# Altium footprint library con-samtec.PCBLIB: 805 footprints (part 42 of 55)
Each footprint in its own frame and in the unit in brackets; x right, y up, seen from the top. Pads: shape width x height; smd on the part's side, far side on the other; paste and mask are expansions set on the pad; w line width, h text height; cw(c..) or ccw(c..) is an arc to the next point about the centre after c.
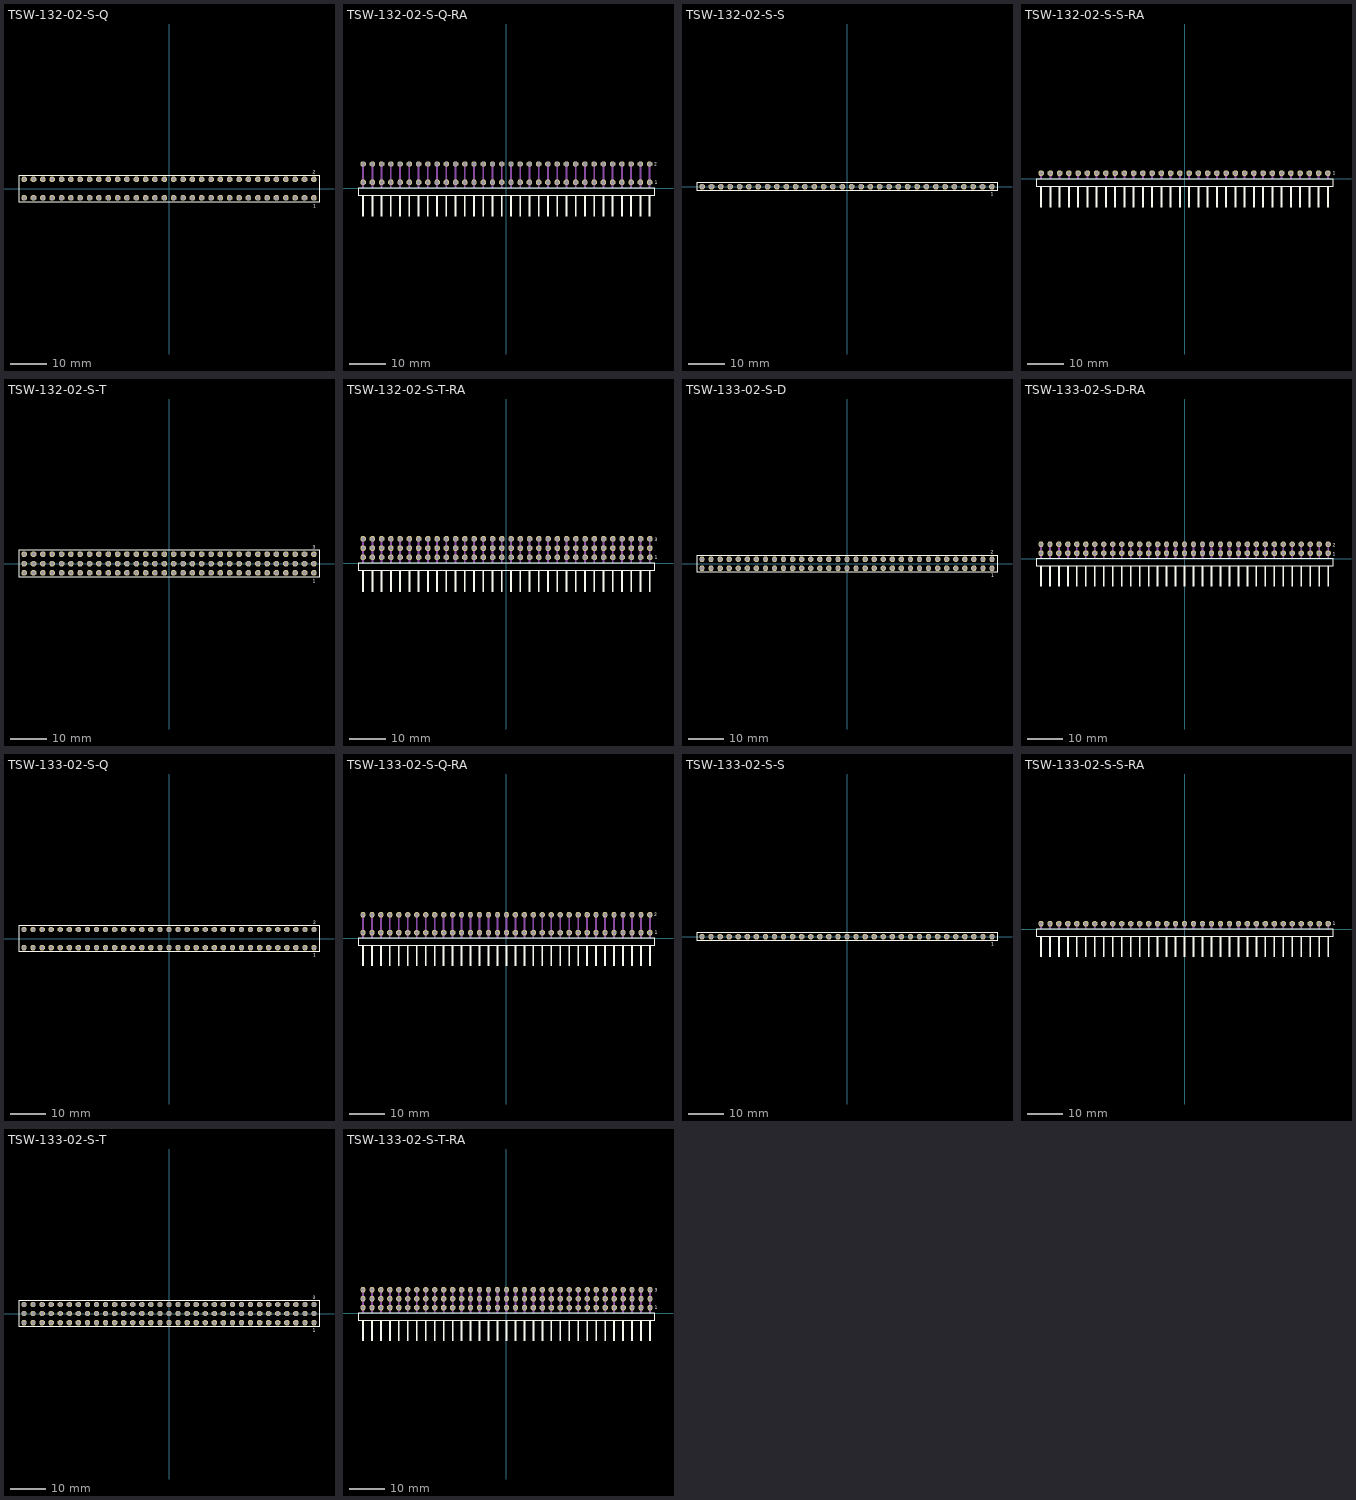
[diagram p41: the footprints below, top view; thin cyan lines are the x and y axes]

## TSW-132-02-S-Q [mm]
pads (64):
  oct 1.5x1.5 hole 1: 1(39.37,-2.54) 2(39.37,2.54) 3(36.83,-2.54) 4(36.83,2.54) 5(34.29,-2.54) 6(34.29,2.54) 7(31.75,-2.54) 8(31.75,2.54) 9(29.21,-2.54) 10(29.21,2.54) 11(26.67,-2.54) 12(26.67,2.54) 13(24.13,-2.54) 14(24.13,2.54) 15(21.59,-2.54) 16(21.59,2.54) 17(19.05,-2.54) 18(19.05,2.54) 19(16.51,-2.54) 20(16.51,2.54) 21(13.97,-2.54) 22(13.97,2.54) 23(11.43,-2.54) 24(11.43,2.54) 25(8.89,-2.54) 26(8.89,2.54) 27(6.35,-2.54) 28(6.35,2.54) 29(3.81,-2.54) 30(3.81,2.54) 31(1.27,-2.54) 32(1.27,2.54) 33(-1.27,-2.54) 34(-1.27,2.54) 35(-3.81,-2.54) 36(-3.81,2.54) 37(-6.35,-2.54) 38(-6.35,2.54) 39(-8.89,-2.54) 40(-8.89,2.54) 41(-11.43,-2.54) 42(-11.43,2.54) 43(-13.97,-2.54) 44(-13.97,2.54) 45(-16.51,-2.54) 46(-16.51,2.54) 47(-19.05,-2.54) 48(-19.05,2.54) 49(-21.59,-2.54) 50(-21.59,2.54) 51(-24.13,-2.54) 52(-24.13,2.54) 53(-26.67,-2.54) 54(-26.67,2.54) 55(-29.21,-2.54) 56(-29.21,2.54) 57(-31.75,-2.54) 58(-31.75,2.54) 59(-34.29,-2.54) 60(-34.29,2.54) 61(-36.83,-2.54) 62(-36.83,2.54) 63(-39.37,-2.54) 64(-39.37,2.54)
Top Overlay:
  lines w0.203: -40.769,-3.695 40.769,-3.695 40.769,3.695 -40.769,3.695 -40.769,-3.695
  text "1" at 39.212,-5.138 h0.94
  text "2" at 39.112,3.989 h0.94
Mechanical 16:
  rectangle: -39.72,-2.89 -39.02,-2.19
  rectangle: -39.72,2.19 -39.02,2.89
  rectangle: -37.18,-2.89 -36.48,-2.19
  rectangle: -37.18,2.19 -36.48,2.89
  rectangle: -34.64,-2.89 -33.94,-2.19
  rectangle: -34.64,2.19 -33.94,2.89
  rectangle: -32.1,-2.89 -31.4,-2.19
  rectangle: -32.1,2.19 -31.4,2.89
  rectangle: -29.56,-2.89 -28.86,-2.19
  rectangle: -29.56,2.19 -28.86,2.89
  rectangle: -27.02,-2.89 -26.32,-2.19
  rectangle: -27.02,2.19 -26.32,2.89
  rectangle: -24.48,-2.89 -23.78,-2.19
  rectangle: -24.48,2.19 -23.78,2.89
  rectangle: -21.94,-2.89 -21.24,-2.19
  rectangle: -21.94,2.19 -21.24,2.89
  rectangle: -19.4,-2.89 -18.7,-2.19
  rectangle: -19.4,2.19 -18.7,2.89
  rectangle: -16.86,-2.89 -16.16,-2.19
  rectangle: -16.86,2.19 -16.16,2.89
  rectangle: -14.32,-2.89 -13.62,-2.19
  rectangle: -14.32,2.19 -13.62,2.89
  rectangle: -11.78,-2.89 -11.08,-2.19
  rectangle: -11.78,2.19 -11.08,2.89
  rectangle: -9.24,-2.89 -8.54,-2.19
  rectangle: -9.24,2.19 -8.54,2.89
  rectangle: -6.7,-2.89 -6,-2.19
  rectangle: -6.7,2.19 -6,2.89
  rectangle: -4.16,-2.89 -3.46,-2.19
  rectangle: -4.16,2.19 -3.46,2.89
  rectangle: -1.62,-2.89 -0.92,-2.19
  rectangle: -1.62,2.19 -0.92,2.89
  rectangle: 0.92,-2.89 1.62,-2.19
  rectangle: 0.92,2.19 1.62,2.89
  rectangle: 3.46,-2.89 4.16,-2.19
  rectangle: 3.46,2.19 4.16,2.89
  rectangle: 6,-2.89 6.7,-2.19
  rectangle: 6,2.19 6.7,2.89
  rectangle: 8.54,-2.89 9.24,-2.19
  rectangle: 8.54,2.19 9.24,2.89
  rectangle: 11.08,-2.89 11.78,-2.19
  rectangle: 11.08,2.19 11.78,2.89
  rectangle: 13.62,-2.89 14.32,-2.19
  rectangle: 13.62,2.19 14.32,2.89
  rectangle: 16.16,-2.89 16.86,-2.19
  rectangle: 16.16,2.19 16.86,2.89
  rectangle: 18.7,-2.89 19.4,-2.19
  rectangle: 18.7,2.19 19.4,2.89
  rectangle: 21.24,-2.89 21.94,-2.19
  rectangle: 21.24,2.19 21.94,2.89
  rectangle: 23.78,-2.89 24.48,-2.19
  rectangle: 23.78,2.19 24.48,2.89
  rectangle: 26.32,-2.89 27.02,-2.19
  rectangle: 26.32,2.19 27.02,2.89
  rectangle: 28.86,-2.89 29.56,-2.19
  rectangle: 28.86,2.19 29.56,2.89
  rectangle: 31.4,-2.89 32.1,-2.19
  rectangle: 31.4,2.19 32.1,2.89
  rectangle: 33.94,-2.89 34.64,-2.19
  rectangle: 33.94,2.19 34.64,2.89
  rectangle: 36.48,-2.89 37.18,-2.19
  rectangle: 36.48,2.19 37.18,2.89
  rectangle: 39.02,-2.89 39.72,-2.19
  rectangle: 39.02,2.19 39.72,2.89

## TSW-132-02-S-Q-RA [mil]
pads (64):
  oct 59.06x59.06 hole 39.37: 1(1550,60) 2(1550,260) 3(1450,60) 4(1450,260) 5(1350,60) 6(1350,260) 7(1250,60) 8(1250,260) 9(1150,60) 10(1150,260) 11(1050,60) 12(1050,260) 13(950,60) 14(950,260) 15(850,60) 16(850,260) 17(750,60) 18(750,260) 19(650,60) 20(650,260) 21(550,60) 22(550,260) 23(450,60) 24(450,260) 25(350,60) 26(350,260) 27(250,60) 28(250,260) 29(150,60) 30(150,260) 31(50,60) 32(50,260) 33(-50,60) 34(-50,260) 35(-150,60) 36(-150,260) 37(-250,60) 38(-250,260) 39(-350,60) 40(-350,260) 41(-450,60) 42(-450,260) 43(-550,60) 44(-550,260) 45(-650,60) 46(-650,260) 47(-750,60) 48(-750,260) 49(-850,60) 50(-850,260) 51(-950,60) 52(-950,260) 53(-1050,60) 54(-1050,260) 55(-1150,60) 56(-1150,260) 57(-1250,60) 58(-1250,260) 59(-1350,60) 60(-1350,260) 61(-1450,60) 62(-1450,260) 63(-1550,60) 64(-1550,260)
Top Overlay:
  rectangle: -1560,-310.63 -1540,-80.32
  rectangle: -1460,-310.63 -1440,-80.32
  rectangle: -1360,-310.63 -1340,-80.32
  rectangle: -1260,-310.63 -1240,-80.32
  rectangle: -1160,-310.63 -1140,-80.32
  rectangle: -1060,-310.63 -1040,-80.32
  rectangle: -960,-310.63 -940,-80.32
  rectangle: -860,-310.63 -840,-80.32
  rectangle: -760,-310.63 -740,-80.32
  rectangle: -660,-310.63 -640,-80.32
  rectangle: -560,-310.63 -540,-80.32
  rectangle: -460,-310.63 -440,-80.32
  rectangle: -360,-310.63 -340,-80.32
  rectangle: -260,-310.63 -240,-80.32
  rectangle: -160,-310.63 -140,-80.32
  rectangle: -60,-310.63 -40,-80.32
  rectangle: 40,-310.63 60,-80.32
  rectangle: 140,-310.63 160,-80.32
  rectangle: 240,-310.63 260,-80.32
  rectangle: 340,-310.63 360,-80.32
  rectangle: 440,-310.63 460,-80.32
  rectangle: 540,-310.63 560,-80.32
  rectangle: 640,-310.63 660,-80.32
  rectangle: 740,-310.63 760,-80.32
  rectangle: 840,-310.63 860,-80.32
  rectangle: 940,-310.63 960,-80.32
  rectangle: 1040,-310.63 1060,-80.32
  rectangle: 1140,-310.63 1160,-80.32
  rectangle: 1240,-310.63 1260,-80.32
  rectangle: 1340,-310.63 1360,-80.32
  rectangle: 1440,-310.63 1460,-80.32
  rectangle: 1540,-310.63 1560,-80.32
  lines w8: -1605.08,-80.55 1605.08,-80.55 1605.08,-4.17 -1605.08,-4.17 -1605.08,-80.55
  text "1" at 1603.54,43.31 h36.81
  text "2" at 1601.18,242.72 h36.81
Mechanical 16:
  rectangle: -1560,0 -1540,270
  rectangle: -1460,0 -1440,270
  rectangle: -1360,0 -1340,270
  rectangle: -1260,0 -1240,270
  rectangle: -1160,0 -1140,270
  rectangle: -1060,0 -1040,270
  rectangle: -960,0 -940,270
  rectangle: -860,0 -840,270
  rectangle: -760,0 -740,270
  rectangle: -660,0 -640,270
  rectangle: -560,0 -540,270
  rectangle: -460,0 -440,270
  rectangle: -360,0 -340,270
  rectangle: -260,0 -240,270
  rectangle: -160,0 -140,270
  rectangle: -60,0 -40,270
  rectangle: 40,0 60,270
  rectangle: 140,0 160,270
  rectangle: 240,0 260,270
  rectangle: 340,0 360,270
  rectangle: 440,0 460,270
  rectangle: 540,0 560,270
  rectangle: 640,0 660,270
  rectangle: 740,0 760,270
  rectangle: 840,0 860,270
  rectangle: 940,0 960,270
  rectangle: 1040,0 1060,270
  rectangle: 1140,0 1160,270
  rectangle: 1240,0 1260,270
  rectangle: 1340,0 1360,270
  rectangle: 1440,0 1460,270
  rectangle: 1540,0 1560,270

## TSW-132-02-S-S [mm]
pads (32):
  oct 1.5x1.5 hole 1: 1(39.37,0) 2(36.83,0) 3(34.29,0) 4(31.75,0) 5(29.21,0) 6(26.67,0) 7(24.13,0) 8(21.59,0) 9(19.05,0) 10(16.51,0) 11(13.97,0) 12(11.43,0) 13(8.89,0) 14(6.35,0) 15(3.81,0) 16(1.27,0) 17(-1.27,0) 18(-3.81,0) 19(-6.35,0) 20(-8.89,0) 21(-11.43,0) 22(-13.97,0) 23(-16.51,0) 24(-19.05,0) 25(-21.59,0) 26(-24.13,0) 27(-26.67,0) 28(-29.21,0) 29(-31.75,0) 30(-34.29,0) 31(-36.83,0) 32(-39.37,0)
Top Overlay:
  lines w0.203: -40.769,-1.155 40.769,-1.155 40.769,1.155 -40.769,1.155 -40.769,-1.155
  text "1" at 39.112,-2.498 h0.94
Mechanical 16:
  rectangle: -39.72,-0.35 -39.02,0.35
  rectangle: -37.18,-0.35 -36.48,0.35
  rectangle: -34.64,-0.35 -33.94,0.35
  rectangle: -32.1,-0.35 -31.4,0.35
  rectangle: -29.56,-0.35 -28.86,0.35
  rectangle: -27.02,-0.35 -26.32,0.35
  rectangle: -24.48,-0.35 -23.78,0.35
  rectangle: -21.94,-0.35 -21.24,0.35
  rectangle: -19.4,-0.35 -18.7,0.35
  rectangle: -16.86,-0.35 -16.16,0.35
  rectangle: -14.32,-0.35 -13.62,0.35
  rectangle: -11.78,-0.35 -11.08,0.35
  rectangle: -9.24,-0.35 -8.54,0.35
  rectangle: -6.7,-0.35 -6,0.35
  rectangle: -4.16,-0.35 -3.46,0.35
  rectangle: -1.62,-0.35 -0.92,0.35
  rectangle: 0.92,-0.35 1.62,0.35
  rectangle: 3.46,-0.35 4.16,0.35
  rectangle: 6,-0.35 6.7,0.35
  rectangle: 8.54,-0.35 9.24,0.35
  rectangle: 11.08,-0.35 11.78,0.35
  rectangle: 13.62,-0.35 14.32,0.35
  rectangle: 16.16,-0.35 16.86,0.35
  rectangle: 18.7,-0.35 19.4,0.35
  rectangle: 21.24,-0.35 21.94,0.35
  rectangle: 23.78,-0.35 24.48,0.35
  rectangle: 26.32,-0.35 27.02,0.35
  rectangle: 28.86,-0.35 29.56,0.35
  rectangle: 31.4,-0.35 32.1,0.35
  rectangle: 33.94,-0.35 34.64,0.35
  rectangle: 36.48,-0.35 37.18,0.35
  rectangle: 39.02,-0.35 39.72,0.35

## TSW-132-02-S-S-RA [mil]
pads (32):
  oct 59.06x59.06 hole 39.37: 1(1550,60) 2(1450,60) 3(1350,60) 4(1250,60) 5(1150,60) 6(1050,60) 7(950,60) 8(850,60) 9(750,60) 10(650,60) 11(550,60) 12(450,60) 13(350,60) 14(250,60) 15(150,60) 16(50,60) 17(-50,60) 18(-150,60) 19(-250,60) 20(-350,60) 21(-450,60) 22(-550,60) 23(-650,60) 24(-750,60) 25(-850,60) 26(-950,60) 27(-1050,60) 28(-1150,60) 29(-1250,60) 30(-1350,60) 31(-1450,60) 32(-1550,60)
Top Overlay:
  rectangle: -1560,-310.63 -1540,-80.32
  rectangle: -1460,-310.63 -1440,-80.32
  rectangle: -1360,-310.63 -1340,-80.32
  rectangle: -1260,-310.63 -1240,-80.32
  rectangle: -1160,-310.63 -1140,-80.32
  rectangle: -1060,-310.63 -1040,-80.32
  rectangle: -960,-310.63 -940,-80.32
  rectangle: -860,-310.63 -840,-80.32
  rectangle: -760,-310.63 -740,-80.32
  rectangle: -660,-310.63 -640,-80.32
  rectangle: -560,-310.63 -540,-80.32
  rectangle: -460,-310.63 -440,-80.32
  rectangle: -360,-310.63 -340,-80.32
  rectangle: -260,-310.63 -240,-80.32
  rectangle: -160,-310.63 -140,-80.32
  rectangle: -60,-310.63 -40,-80.32
  rectangle: 40,-310.63 60,-80.32
  rectangle: 140,-310.63 160,-80.32
  rectangle: 240,-310.63 260,-80.32
  rectangle: 340,-310.63 360,-80.32
  rectangle: 440,-310.63 460,-80.32
  rectangle: 540,-310.63 560,-80.32
  rectangle: 640,-310.63 660,-80.32
  rectangle: 740,-310.63 760,-80.32
  rectangle: 840,-310.63 860,-80.32
  rectangle: 940,-310.63 960,-80.32
  rectangle: 1040,-310.63 1060,-80.32
  rectangle: 1140,-310.63 1160,-80.32
  rectangle: 1240,-310.63 1260,-80.32
  rectangle: 1340,-310.63 1360,-80.32
  rectangle: 1440,-310.63 1460,-80.32
  rectangle: 1540,-310.63 1560,-80.32
  lines w8: -1605.08,-80.55 1605.08,-80.55 1605.08,-4.17 -1605.08,-4.17 -1605.08,-80.55
  text "1" at 1600.47,45.35 h36.81
Mechanical 16:
  rectangle: -1560,0 -1540,70
  rectangle: -1460,0 -1440,70
  rectangle: -1360,0 -1340,70
  rectangle: -1260,0 -1240,70
  rectangle: -1160,0 -1140,70
  rectangle: -1060,0 -1040,70
  rectangle: -960,0 -940,70
  rectangle: -860,0 -840,70
  rectangle: -760,0 -740,70
  rectangle: -660,0 -640,70
  rectangle: -560,0 -540,70
  rectangle: -460,0 -440,70
  rectangle: -360,0 -340,70
  rectangle: -260,0 -240,70
  rectangle: -160,0 -140,70
  rectangle: -60,0 -40,70
  rectangle: 40,0 60,70
  rectangle: 140,0 160,70
  rectangle: 240,0 260,70
  rectangle: 340,0 360,70
  rectangle: 440,0 460,70
  rectangle: 540,0 560,70
  rectangle: 640,0 660,70
  rectangle: 740,0 760,70
  rectangle: 840,0 860,70
  rectangle: 940,0 960,70
  rectangle: 1040,0 1060,70
  rectangle: 1140,0 1160,70
  rectangle: 1240,0 1260,70
  rectangle: 1340,0 1360,70
  rectangle: 1440,0 1460,70
  rectangle: 1540,0 1560,70

## TSW-132-02-S-T [mm]
pads (96):
  oct 1.5x1.5 hole 1: 1(39.37,-2.54) 2(39.37,0) 3(39.37,2.54) 4(36.83,-2.54) 5(36.83,0) 6(36.83,2.54) 7(34.29,-2.54) 8(34.29,0) 9(34.29,2.54) 10(31.75,-2.54) 11(31.75,0) 12(31.75,2.54) 13(29.21,-2.54) 14(29.21,0) 15(29.21,2.54) 16(26.67,-2.54) 17(26.67,0) 18(26.67,2.54) 19(24.13,-2.54) 20(24.13,0) 21(24.13,2.54) 22(21.59,-2.54) 23(21.59,0) 24(21.59,2.54) 25(19.05,-2.54) 26(19.05,0) 27(19.05,2.54) 28(16.51,-2.54) 29(16.51,0) 30(16.51,2.54) 31(13.97,-2.54) 32(13.97,0) 33(13.97,2.54) 34(11.43,-2.54) 35(11.43,0) 36(11.43,2.54) 37(8.89,-2.54) 38(8.89,0) 39(8.89,2.54) 40(6.35,-2.54) 41(6.35,0) 42(6.35,2.54) 43(3.81,-2.54) 44(3.81,0) 45(3.81,2.54) 46(1.27,-2.54) 47(1.27,0) 48(1.27,2.54) 49(-1.27,-2.54) 50(-1.27,0) 51(-1.27,2.54) 52(-3.81,-2.54) 53(-3.81,0) 54(-3.81,2.54) 55(-6.35,-2.54) 56(-6.35,0) 57(-6.35,2.54) 58(-8.89,-2.54) 59(-8.89,0) 60(-8.89,2.54) 61(-11.43,-2.54) 62(-11.43,0) 63(-11.43,2.54) 64(-13.97,-2.54) 65(-13.97,0) 66(-13.97,2.54) 67(-16.51,-2.54) 68(-16.51,0) 69(-16.51,2.54) 70(-19.05,-2.54) 71(-19.05,0) 72(-19.05,2.54) 73(-21.59,-2.54) 74(-21.59,0) 75(-21.59,2.54) 76(-24.13,-2.54) 77(-24.13,0) 78(-24.13,2.54) 79(-26.67,-2.54) 80(-26.67,0) 81(-26.67,2.54) 82(-29.21,-2.54) 83(-29.21,0) 84(-29.21,2.54) 85(-31.75,-2.54) 86(-31.75,0) 87(-31.75,2.54) 88(-34.29,-2.54) 89(-34.29,0) 90(-34.29,2.54) 91(-36.83,-2.54) 92(-36.83,0) 93(-36.83,2.54) 94(-39.37,-2.54) 95(-39.37,0) 96(-39.37,2.54)
Top Overlay:
  lines w0.203: -40.769,-3.695 40.769,-3.695 40.769,3.695 -40.769,3.695 -40.769,-3.695
  text "1" at 39.062,-5.188 h0.94
  text "3" at 39.058,3.989 h0.94
Mechanical 16:
  rectangle: -39.72,-2.89 -39.02,-2.19
  rectangle: -39.72,-0.35 -39.02,0.35
  rectangle: -39.72,2.19 -39.02,2.89
  rectangle: -37.18,-2.89 -36.48,-2.19
  rectangle: -37.18,-0.35 -36.48,0.35
  rectangle: -37.18,2.19 -36.48,2.89
  rectangle: -34.64,-2.89 -33.94,-2.19
  rectangle: -34.64,-0.35 -33.94,0.35
  rectangle: -34.64,2.19 -33.94,2.89
  rectangle: -32.1,-2.89 -31.4,-2.19
  rectangle: -32.1,-0.35 -31.4,0.35
  rectangle: -32.1,2.19 -31.4,2.89
  rectangle: -29.56,-2.89 -28.86,-2.19
  rectangle: -29.56,-0.35 -28.86,0.35
  rectangle: -29.56,2.19 -28.86,2.89
  rectangle: -27.02,-2.89 -26.32,-2.19
  rectangle: -27.02,-0.35 -26.32,0.35
  rectangle: -27.02,2.19 -26.32,2.89
  rectangle: -24.48,-2.89 -23.78,-2.19
  rectangle: -24.48,-0.35 -23.78,0.35
  rectangle: -24.48,2.19 -23.78,2.89
  rectangle: -21.94,-2.89 -21.24,-2.19
  rectangle: -21.94,-0.35 -21.24,0.35
  rectangle: -21.94,2.19 -21.24,2.89
  rectangle: -19.4,-2.89 -18.7,-2.19
  rectangle: -19.4,-0.35 -18.7,0.35
  rectangle: -19.4,2.19 -18.7,2.89
  rectangle: -16.86,-2.89 -16.16,-2.19
  rectangle: -16.86,-0.35 -16.16,0.35
  rectangle: -16.86,2.19 -16.16,2.89
  rectangle: -14.32,-2.89 -13.62,-2.19
  rectangle: -14.32,-0.35 -13.62,0.35
  rectangle: -14.32,2.19 -13.62,2.89
  rectangle: -11.78,-2.89 -11.08,-2.19
  rectangle: -11.78,-0.35 -11.08,0.35
  rectangle: -11.78,2.19 -11.08,2.89
  rectangle: -9.24,-2.89 -8.54,-2.19
  rectangle: -9.24,-0.35 -8.54,0.35
  rectangle: -9.24,2.19 -8.54,2.89
  rectangle: -6.7,-2.89 -6,-2.19
  rectangle: -6.7,-0.35 -6,0.35
  rectangle: -6.7,2.19 -6,2.89
  rectangle: -4.16,-2.89 -3.46,-2.19
  rectangle: -4.16,-0.35 -3.46,0.35
  rectangle: -4.16,2.19 -3.46,2.89
  rectangle: -1.62,-2.89 -0.92,-2.19
  rectangle: -1.62,-0.35 -0.92,0.35
  rectangle: -1.62,2.19 -0.92,2.89
  rectangle: 0.92,-2.89 1.62,-2.19
  rectangle: 0.92,-0.35 1.62,0.35
  rectangle: 0.92,2.19 1.62,2.89
  rectangle: 3.46,-2.89 4.16,-2.19
  rectangle: 3.46,-0.35 4.16,0.35
  rectangle: 3.46,2.19 4.16,2.89
  rectangle: 6,-2.89 6.7,-2.19
  rectangle: 6,-0.35 6.7,0.35
  rectangle: 6,2.19 6.7,2.89
  rectangle: 8.54,-2.89 9.24,-2.19
  rectangle: 8.54,-0.35 9.24,0.35
  rectangle: 8.54,2.19 9.24,2.89
  rectangle: 11.08,-2.89 11.78,-2.19
  rectangle: 11.08,-0.35 11.78,0.35
  rectangle: 11.08,2.19 11.78,2.89
  rectangle: 13.62,-2.89 14.32,-2.19
  rectangle: 13.62,-0.35 14.32,0.35
  rectangle: 13.62,2.19 14.32,2.89
  rectangle: 16.16,-2.89 16.86,-2.19
  rectangle: 16.16,-0.35 16.86,0.35
  rectangle: 16.16,2.19 16.86,2.89
  rectangle: 18.7,-2.89 19.4,-2.19
  rectangle: 18.7,-0.35 19.4,0.35
  rectangle: 18.7,2.19 19.4,2.89
  rectangle: 21.24,-2.89 21.94,-2.19
  rectangle: 21.24,-0.35 21.94,0.35
  rectangle: 21.24,2.19 21.94,2.89
  rectangle: 23.78,-2.89 24.48,-2.19
  rectangle: 23.78,-0.35 24.48,0.35
  rectangle: 23.78,2.19 24.48,2.89
  rectangle: 26.32,-2.89 27.02,-2.19
  rectangle: 26.32,-0.35 27.02,0.35
  rectangle: 26.32,2.19 27.02,2.89
  rectangle: 28.86,-2.89 29.56,-2.19
  rectangle: 28.86,-0.35 29.56,0.35
  rectangle: 28.86,2.19 29.56,2.89
  rectangle: 31.4,-2.89 32.1,-2.19
  rectangle: 31.4,-0.35 32.1,0.35
  rectangle: 31.4,2.19 32.1,2.89
  rectangle: 33.94,-2.89 34.64,-2.19
  rectangle: 33.94,-0.35 34.64,0.35
  rectangle: 33.94,2.19 34.64,2.89
  rectangle: 36.48,-2.89 37.18,-2.19
  rectangle: 36.48,-0.35 37.18,0.35
  rectangle: 36.48,2.19 37.18,2.89
  rectangle: 39.02,-2.89 39.72,-2.19
  rectangle: 39.02,-0.35 39.72,0.35
  rectangle: 39.02,2.19 39.72,2.89

## TSW-132-02-S-T-RA [mil]
pads (96):
  oct 59.06x59.06 hole 39.37: 1(1550,60) 2(1550,160) 3(1550,260) 4(1450,60) 5(1450,160) 6(1450,260) 7(1350,60) 8(1350,160) 9(1350,260) 10(1250,60) 11(1250,160) 12(1250,260) 13(1150,60) 14(1150,160) 15(1150,260) 16(1050,60) 17(1050,160) 18(1050,260) 19(950,60) 20(950,160) 21(950,260) 22(850,60) 23(850,160) 24(850,260) 25(750,60) 26(750,160) 27(750,260) 28(650,60) 29(650,160) 30(650,260) 31(550,60) 32(550,160) 33(550,260) 34(450,60) 35(450,160) 36(450,260) 37(350,60) 38(350,160) 39(350,260) 40(250,60) 41(250,160) 42(250,260) 43(150,60) 44(150,160) 45(150,260) 46(50,60) 47(50,160) 48(50,260) 49(-50,60) 50(-50,160) 51(-50,260) 52(-150,60) 53(-150,160) 54(-150,260) 55(-250,60) 56(-250,160) 57(-250,260) 58(-350,60) 59(-350,160) 60(-350,260) 61(-450,60) 62(-450,160) 63(-450,260) 64(-550,60) 65(-550,160) 66(-550,260) 67(-650,60) 68(-650,160) 69(-650,260) 70(-750,60) 71(-750,160) 72(-750,260) 73(-850,60) 74(-850,160) 75(-850,260) 76(-950,60) 77(-950,160) 78(-950,260) 79(-1050,60) 80(-1050,160) 81(-1050,260) 82(-1150,60) 83(-1150,160) 84(-1150,260) 85(-1250,60) 86(-1250,160) 87(-1250,260) 88(-1350,60) 89(-1350,160) 90(-1350,260) 91(-1450,60) 92(-1450,160) 93(-1450,260) 94(-1550,60) 95(-1550,160) 96(-1550,260)
Top Overlay:
  rectangle: -1560,-310.63 -1540,-80.32
  rectangle: -1460,-310.63 -1440,-80.32
  rectangle: -1360,-310.63 -1340,-80.32
  rectangle: -1260,-310.63 -1240,-80.32
  rectangle: -1160,-310.63 -1140,-80.32
  rectangle: -1060,-310.63 -1040,-80.32
  rectangle: -960,-310.63 -940,-80.32
  rectangle: -860,-310.63 -840,-80.32
  rectangle: -760,-310.63 -740,-80.32
  rectangle: -660,-310.63 -640,-80.32
  rectangle: -560,-310.63 -540,-80.32
  rectangle: -460,-310.63 -440,-80.32
  rectangle: -360,-310.63 -340,-80.32
  rectangle: -260,-310.63 -240,-80.32
  rectangle: -160,-310.63 -140,-80.32
  rectangle: -60,-310.63 -40,-80.32
  rectangle: 40,-310.63 60,-80.32
  rectangle: 140,-310.63 160,-80.32
  rectangle: 240,-310.63 260,-80.32
  rectangle: 340,-310.63 360,-80.32
  rectangle: 440,-310.63 460,-80.32
  rectangle: 540,-310.63 560,-80.32
  rectangle: 640,-310.63 660,-80.32
  rectangle: 740,-310.63 760,-80.32
  rectangle: 840,-310.63 860,-80.32
  rectangle: 940,-310.63 960,-80.32
  rectangle: 1040,-310.63 1060,-80.32
  rectangle: 1140,-310.63 1160,-80.32
  rectangle: 1240,-310.63 1260,-80.32
  rectangle: 1340,-310.63 1360,-80.32
  rectangle: 1440,-310.63 1460,-80.32
  rectangle: 1540,-310.63 1560,-80.32
  lines w8: -1605.08,-80.55 1605.08,-80.55 1605.08,-4.17 -1605.08,-4.17 -1605.08,-80.55
  text "1" at 1601.57,41.34 h36.81
  text "3" at 1602.17,236.81 h36.81
Mechanical 16:
  rectangle: -1560,0 -1540,270
  rectangle: -1460,0 -1440,270
  rectangle: -1360,0 -1340,270
  rectangle: -1260,0 -1240,270
  rectangle: -1160,0 -1140,270
  rectangle: -1060,0 -1040,270
  rectangle: -960,0 -940,270
  rectangle: -860,0 -840,270
  rectangle: -760,0 -740,270
  rectangle: -660,0 -640,270
  rectangle: -560,0 -540,270
  rectangle: -460,0 -440,270
  rectangle: -360,0 -340,270
  rectangle: -260,0 -240,270
  rectangle: -160,0 -140,270
  rectangle: -60,0 -40,270
  rectangle: 40,0 60,270
  rectangle: 140,0 160,270
  rectangle: 240,0 260,270
  rectangle: 340,0 360,270
  rectangle: 440,0 460,270
  rectangle: 540,0 560,270
  rectangle: 640,0 660,270
  rectangle: 740,0 760,270
  rectangle: 840,0 860,270
  rectangle: 940,0 960,270
  rectangle: 1040,0 1060,270
  rectangle: 1140,0 1160,270
  rectangle: 1240,0 1260,270
  rectangle: 1340,0 1360,270
  rectangle: 1440,0 1460,270
  rectangle: 1540,0 1560,270
